# Altium schematic symbol library 13-Logicold 逻辑 IC.SchLib: 297 symbols (part 6 of 30)
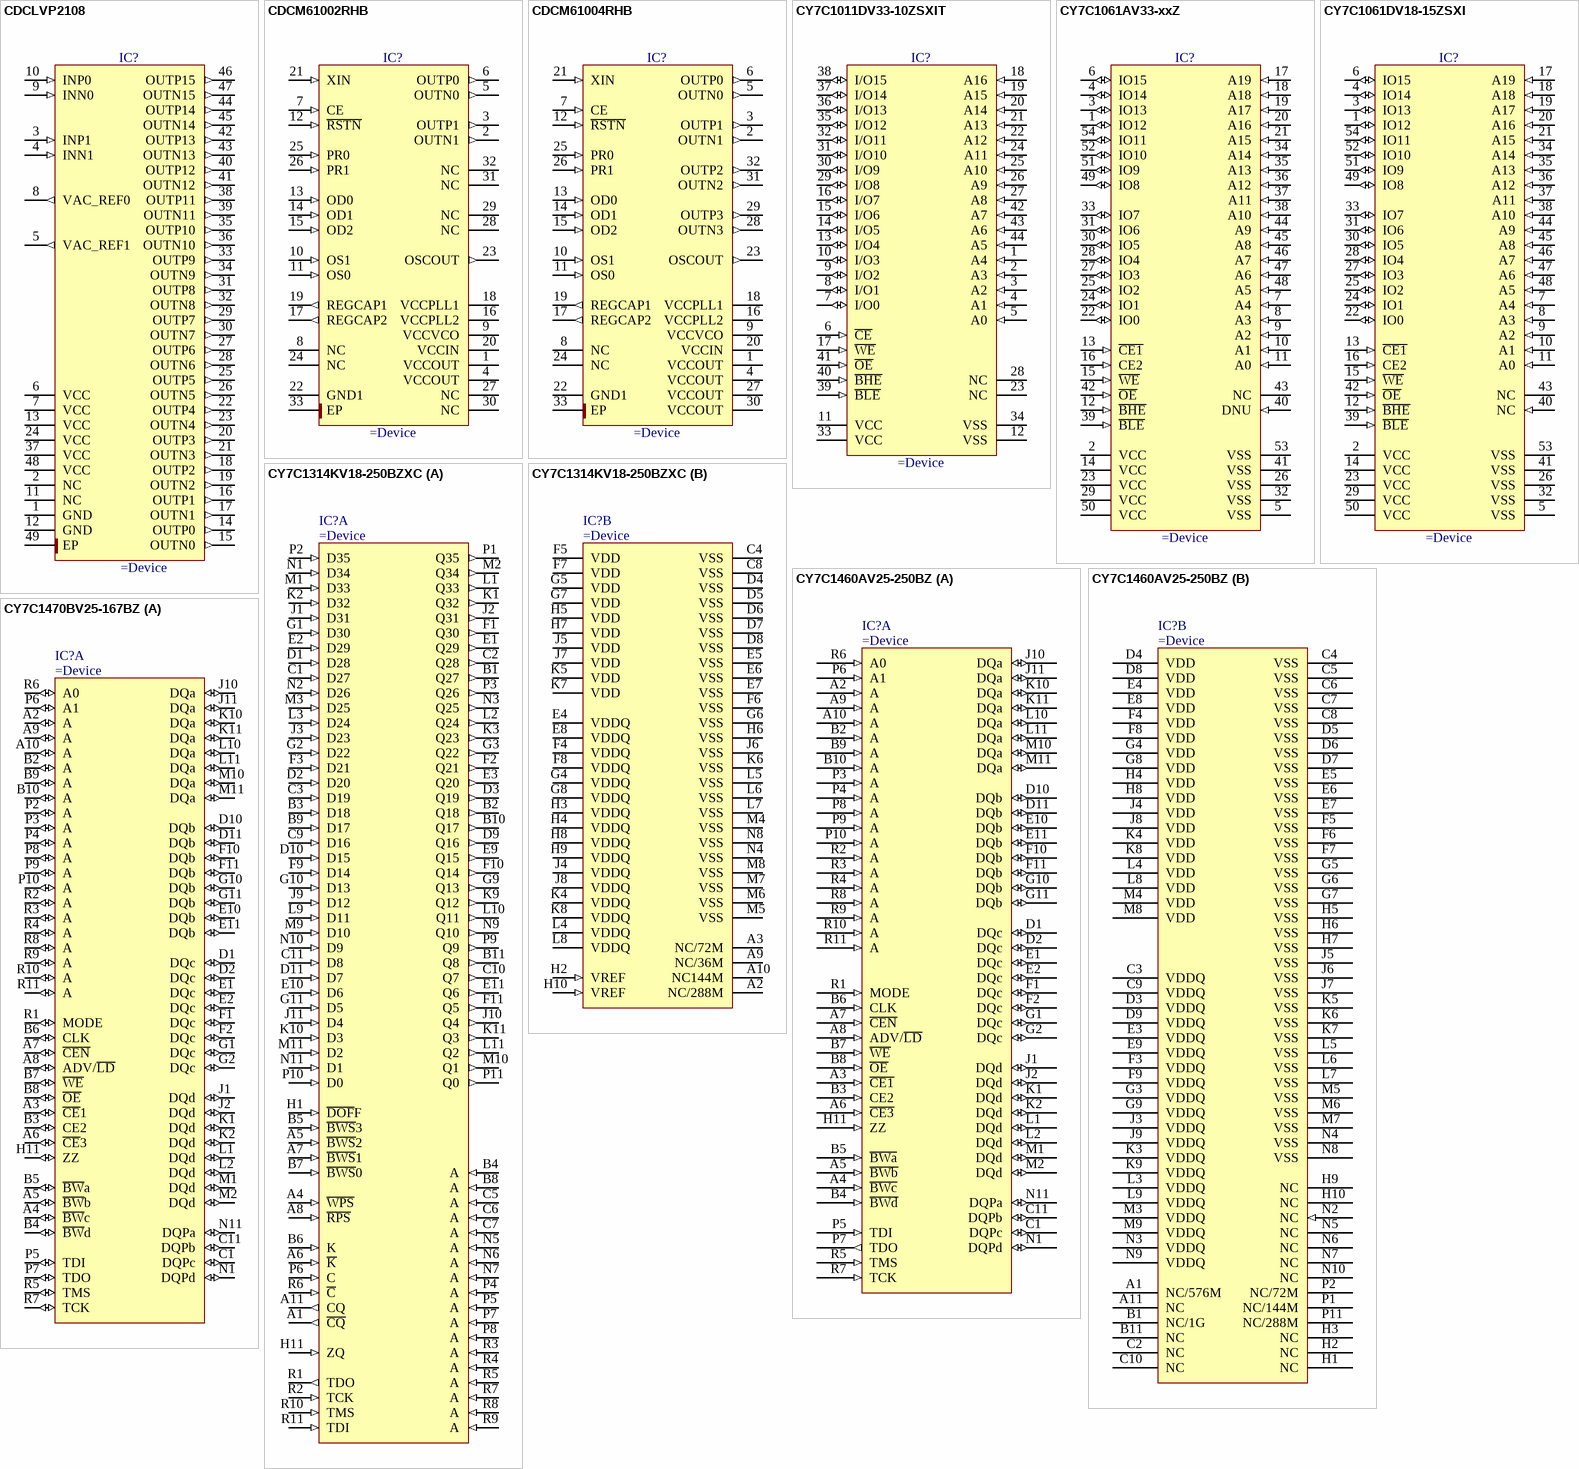
[diagram p167: symbols CDCLVP2108 to CY7C1470BV25-167BZ]

## CDCM61004RHB
designator IC?
Four Output, Integrated VCO, Low-Jitter Clock Generator
pins: 1 VCCOUT (power), 2 OUTN1 (out), 3 OUTP1 (out), 4 VCCOUT (power), 5 OUTN0 (out), 6 OUTP0 (out), 7 CE (in), 8 NC, 9 VCCVCO (power), 10 OS1 (in), 11 OS0 (in), 12 ~{RSTN} (in), 13 OD0 (in), 14 OD1 (in), 15 OD2 (in), 16 VCCPLL2 (power), 17 REGCAP2 (out), 18 VCCPLL1 (power), 19 REGCAP1 (out), 20 VCCIN (power), 21 XIN (in), 22 GND1 (power), 23 OSCOUT (out), 24 NC, 25 PR0 (in), 26 PR1 (in), 27 VCCOUT (power), 28 OUTN3 (out), 29 OUTP3 (out), 30 VCCOUT (power), 31 OUTN2 (out), 32 OUTP2 (out), 33 EP (power)

## CY7C1011DV33-10ZSXIT
designator IC?
2Mbit (128K x 16), 10ns 3.3V Static RAM
pins: 1 A4 (in), 2 A3 (in), 3 A2 (in), 4 A1 (in), 5 A0 (in), 6 ~{CE} (in), 7 I/O0 (io), 8 I/O1 (io), 9 I/O2 (io), 10 I/O3 (io), 11 VCC (power), 12 VSS (power), 13 I/O4 (io), 14 I/O5 (io), 15 I/O6 (io), 16 I/O7 (io), 17 ~{WE} (in), 18 A16 (in), 19 A15 (in), 20 A14 (in), 21 A13 (in), 22 A12 (in), 23 NC, 24 A11 (in), 25 A10 (in), 26 A9 (in), 27 A8 (in), 28 NC, 29 I/O8 (io), 30 I/O9 (io), 31 I/O10 (io), 32 I/O11 (io), 33 VCC (power), 34 VSS (power), 35 I/O12 (io), 36 I/O13 (io), 37 I/O14 (io), 38 I/O15 (io), 39 ~{BLE} (in), 40 ~{BHE} (in), 41 ~{OE} (in), 42 A7 (in), 43 A6 (in), 44 A5 (in)

## CY7C1061AV33-xxZ
designator IC?
16-Mbit (1M x 16) Static RAM
pins: 1 IO12 (io), 2 VCC (power), 3 IO13 (io), 4 IO14 (io), 5 VSS (power), 6 IO15 (io), 7 A4 (in), 8 A3 (in), 9 A2 (in), 10 A1 (in), 11 A0 (in), 12 ~{BHE} (in), 13 ~{CE1} (in), 14 VCC (power), 15 ~{WE} (in), 16 CE2 (in), 17 A19 (in), 18 A18 (in), 19 A17 (in), 20 A16 (in), 21 A15 (in), 22 IO0 (io), 23 VCC (power), 24 IO1 (io), 25 IO2 (io), 26 VSS (power), 27 IO3 (io), 28 IO4 (io), 29 VCC (power), 30 IO5 (io), 31 IO6 (io), 32 VSS (power), 33 IO7 (io), 34 A14 (in), 35 A13 (in), 36 A12 (in), 37 A11 (in), 38 A10 (in), 39 ~{BLE} (in), 40 DNU (in), 41 VSS (power), 42 ~{OE} (in), 43 NC, 44 A9 (in), 45 A8 (in), 46 A7 (in), 47 A6 (in), 48 A5 (in), 49 IO8 (io), 50 VCC (power), 51 IO9 (io), 52 IO10 (io), 53 VSS (power), 54 IO11 (io)

## CY7C1061DV18-15ZSXI
designator IC?
16-Mbit (1M x 16) Static RAM
pins: 1 IO12 (io), 2 VCC (power), 3 IO13 (io), 4 IO14 (io), 5 VSS (power), 6 IO15 (io), 7 A4 (in), 8 A3 (in), 9 A2 (in), 10 A1 (in), 11 A0 (in), 12 ~{BHE} (in), 13 ~{CE1} (in), 14 VCC (power), 15 ~{WE} (in), 16 CE2 (in), 17 A19 (in), 18 A18 (in), 19 A17 (in), 20 A16 (in), 21 A15 (in), 22 IO0 (io), 23 VCC (power), 24 IO1 (io), 25 IO2 (io), 26 VSS (power), 27 IO3 (io), 28 IO4 (io), 29 VCC (power), 30 IO5 (io), 31 IO6 (io), 32 VSS (power), 33 IO7 (io), 34 A14 (in), 35 A13 (in), 36 A12 (in), 37 A11 (in), 38 A10 (in), 39 ~{BLE} (in), 40 NC (in), 41 VSS (power), 42 ~{OE} (in), 43 NC, 44 A9 (in), 45 A8 (in), 46 A7 (in), 47 A6 (in), 48 A5 (in), 49 IO8 (io), 50 VCC (power), 51 IO9 (io), 52 IO10 (io), 53 VSS (power), 54 IO11 (io)

## CY7C1314KV18-250BZXC
designator IC?
1.8V, 250MHz, 18-Mbit (512k X 36) QDR®II SRAM 2-Word Burst Architecture
part A pins: A1 ~{CQ} (out), A4 ~{WPS} (in), A5 ~{BWS}2 (in), A6 ~{K} (in), A7 ~{BWS}1 (in), A8 ~{RPS} (in), A11 CQ (out), B1 Q27 (out), B2 Q18 (out), B3 D18 (in), B4 A (in), B5 ~{BWS}3 (in), B6 K (in), B7 ~{BWS}0 (in), B8 A (in), B9 D17 (in), B10 Q17 (out), B11 Q8 (out), C1 D27 (in), C2 Q28 (out), C3 D19 (in), C5 A (in), C6 A (in), C7 A (in), C9 D16 (in), C10 Q7 (out), C11 D8 (in), D1 D28 (in), D2 D20 (in), D3 Q19 (out), D9 Q16 (out), D10 D15 (in), D11 D7 (in), E1 Q29 (out), E2 D29 (in), E3 Q20 (out), E9 Q15 (out), E10 D6 (in), E11 Q6 (out), F1 Q30 (out), F2 Q21 (out), F3 D21 (in), F9 D14 (in), F10 Q14 (out), F11 Q5 (out), G1 D30 (in), G2 D22 (in), G3 Q22 (out), G9 Q13 (out), G10 D13 (in), G11 D5 (in), H1 ~{DOF}F (in), H11 ZQ (in), J1 D31 (in), J2 Q31 (out), J3 D23 (in), J9 D12 (in), J10 Q4 (out), J11 D4 (in), K1 Q32 (out), K2 D32 (in), K3 Q23 (out), K9 Q12 (out), K10 D3 (in), K11 Q3 (out), L1 Q33 (out), L2 Q24 (out), L3 D24 (in), L9 D11 (in), L10 Q11 (out), L11 Q2 (out), M1 D33 (in), M2 Q34 (out), M3 D25 (in), M9 D10 (in), M10 Q1 (out), M11 D2 (in), N1 D34 (in), N2 D26 (in), N3 Q25 (out), N5 A (in), N6 A (in), N7 A (in), N9 Q10 (out), N10 D9 (in), N11 D1 (in), P1 Q35 (out), P2 D35 (in), P3 Q26 (out), P4 A (in), P5 A (in), P6 C (in), P7 A (in), P8 A (in), P9 Q9 (out), P10 D0 (in), P11 Q0 (out), R1 TDO (out), R2 TCK (in), R3 A (in), R4 A (in), R5 A (in), R6 ~{C} (in), R7 A (in), R8 A (in), R9 A (in), R10 TMS (in), R11 TDI (in)
part B pins: A2 NC/288M, A3 NC/72M, A9 NC/36M, A10 NC144M, C4 VSS (power), C8 VSS (power), D4 VSS (power), D5 VSS (power), D6 VSS (power), D7 VSS (power), D8 VSS (power), E4 VDDQ (power), E5 VSS (power), E6 VSS (power), E7 VSS (power), E8 VDDQ (power), F4 VDDQ (power), F5 VDD (power), F6 VSS (power), F7 VDD (power), F8 VDDQ (power), G4 VDDQ (power), G5 VDD (power), G6 VSS (power), G7 VDD (power), G8 VDDQ (power), H2 VREF (in), H3 VDDQ (power), H4 VDDQ (power), H5 VDD (power), H6 VSS (power), H7 VDD (power), H8 VDDQ (power), H9 VDDQ (power), H10 VREF (in), J4 VDDQ (power), J5 VDD (power), J6 VSS (power), J7 VDD (power), J8 VDDQ (power), K4 VDDQ (power), K5 VDD (power), K6 VSS (power), K7 VDD (power), K8 VDDQ (power), L4 VDDQ (power), L5 VSS (power), L6 VSS (power), L7 VSS (power), L8 VDDQ (power), M4 VSS (power), M5 VSS (power), M6 VSS (power), M7 VSS (power), M8 VSS (power), N4 VSS (power), N8 VSS (power)

## CY7C1460AV25-250BZ
designator IC?
36-Mbit (1M x 36) Pipelined SRAM with NoBL Architecture
part A pins: A2 A (in), A3 ~{CE1} (in), A4 ~{BWc} (in), A5 ~{BWb} (in), A6 ~{CE3} (in), A7 ~{CEN} (in), A8 ADV/~{LD} (in), A9 A (in), A10 A (in), B2 A (in), B3 CE2 (in), B4 ~{BWd} (in), B5 ~{BWa} (in), B6 CLK (in), B7 ~{WE} (in), B8 ~{OE} (in), B9 A (in), B10 A (in), C1 DQPc (io), C11 DQPb (io), D1 DQc (io), D2 DQc (io), D10 DQb (io), D11 DQb (io), E1 DQc (io), E2 DQc (io), E10 DQb (io), E11 DQb (io), F1 DQc (io), F2 DQc (io), F10 DQb (io), F11 DQb (io), G1 DQc (io), G2 DQc (io), G10 DQb (io), G11 DQb (io), H11 ZZ (in), J1 DQd (io), J2 DQd (io), J10 DQa (io), J11 DQa (io), K1 DQd (io), K2 DQd (io), K10 DQa (io), K11 DQa (io), L1 DQd (io), L2 DQd (io), L10 DQa (io), L11 DQa (io), M1 DQd (io), M2 DQd (io), M10 DQa (io), M11 DQa (io), N1 DQPd (io), N11 DQPa (io), P3 A (in), P4 A (in), P5 TDI (in), P6 A1 (in), P7 TDO (out), P8 A (in), P9 A (in), P10 A (in), R1 MODE (in), R2 A (in), R3 A (in), R4 A (in), R5 TMS (in), R6 A0 (in), R7 TCK (in), R8 A (in), R9 A (in), R10 A (in), R11 A (in)
part B pins: A1 NC/576M, A11 NC, B1 NC/1G, B11 NC, C2 NC, C3 VDDQ (power), C4 VSS (power), C5 VSS (power), C6 VSS (power), C7 VSS (power), C8 VSS (power), C9 VDDQ (power), C10 NC, D3 VDDQ (power), D4 VDD (power), D5 VSS (power), D6 VSS (power), D7 VSS (power), D8 VDD (power), D9 VDDQ (power), E3 VDDQ (power), E4 VDD (power), E5 VSS (power), E6 VSS (power), E7 VSS (power), E8 VDD (power), E9 VDDQ (power), F3 VDDQ (power), F4 VDD (power), F5 VSS (power), F6 VSS (power), F7 VSS (power), F8 VDD (power), F9 VDDQ (power), G3 VDDQ (power), G4 VDD (power), G5 VSS (power), G6 VSS (power), G7 VSS (power), G8 VDD (power), G9 VDDQ (power), H1 NC, H2 NC, H3 NC, H4 VDD (power), H5 VSS (power), H6 VSS (power), H7 VSS (power), H8 VDD (power), H9 NC, H10 NC, J3 VDDQ (power), J4 VDD (power), J5 VSS (power), J6 VSS (power), J7 VSS (power), J8 VDD (power), J9 VDDQ (power), K3 VDDQ (power), K4 VDD (power), K5 VSS (power), K6 VSS (power), K7 VSS (power), K8 VDD (power), K9 VDDQ (power), L3 VDDQ (power), L4 VDD (power), L5 VSS (power), L6 VSS (power), L7 VSS (power), L8 VDD (power), L9 VDDQ (power), M3 VDDQ (power), M4 VDD (power), M5 VSS (power), M6 VSS (power), M7 VSS (power), M8 VDD (power), M9 VDDQ (power), N2 NC (in), N3 VDDQ (power), N4 VSS (power), N5 NC, N6 NC, N7 NC, N8 VSS (power), N9 VDDQ (power), N10 NC, P1 NC/144M, P2 NC/72M, P11 NC/288M

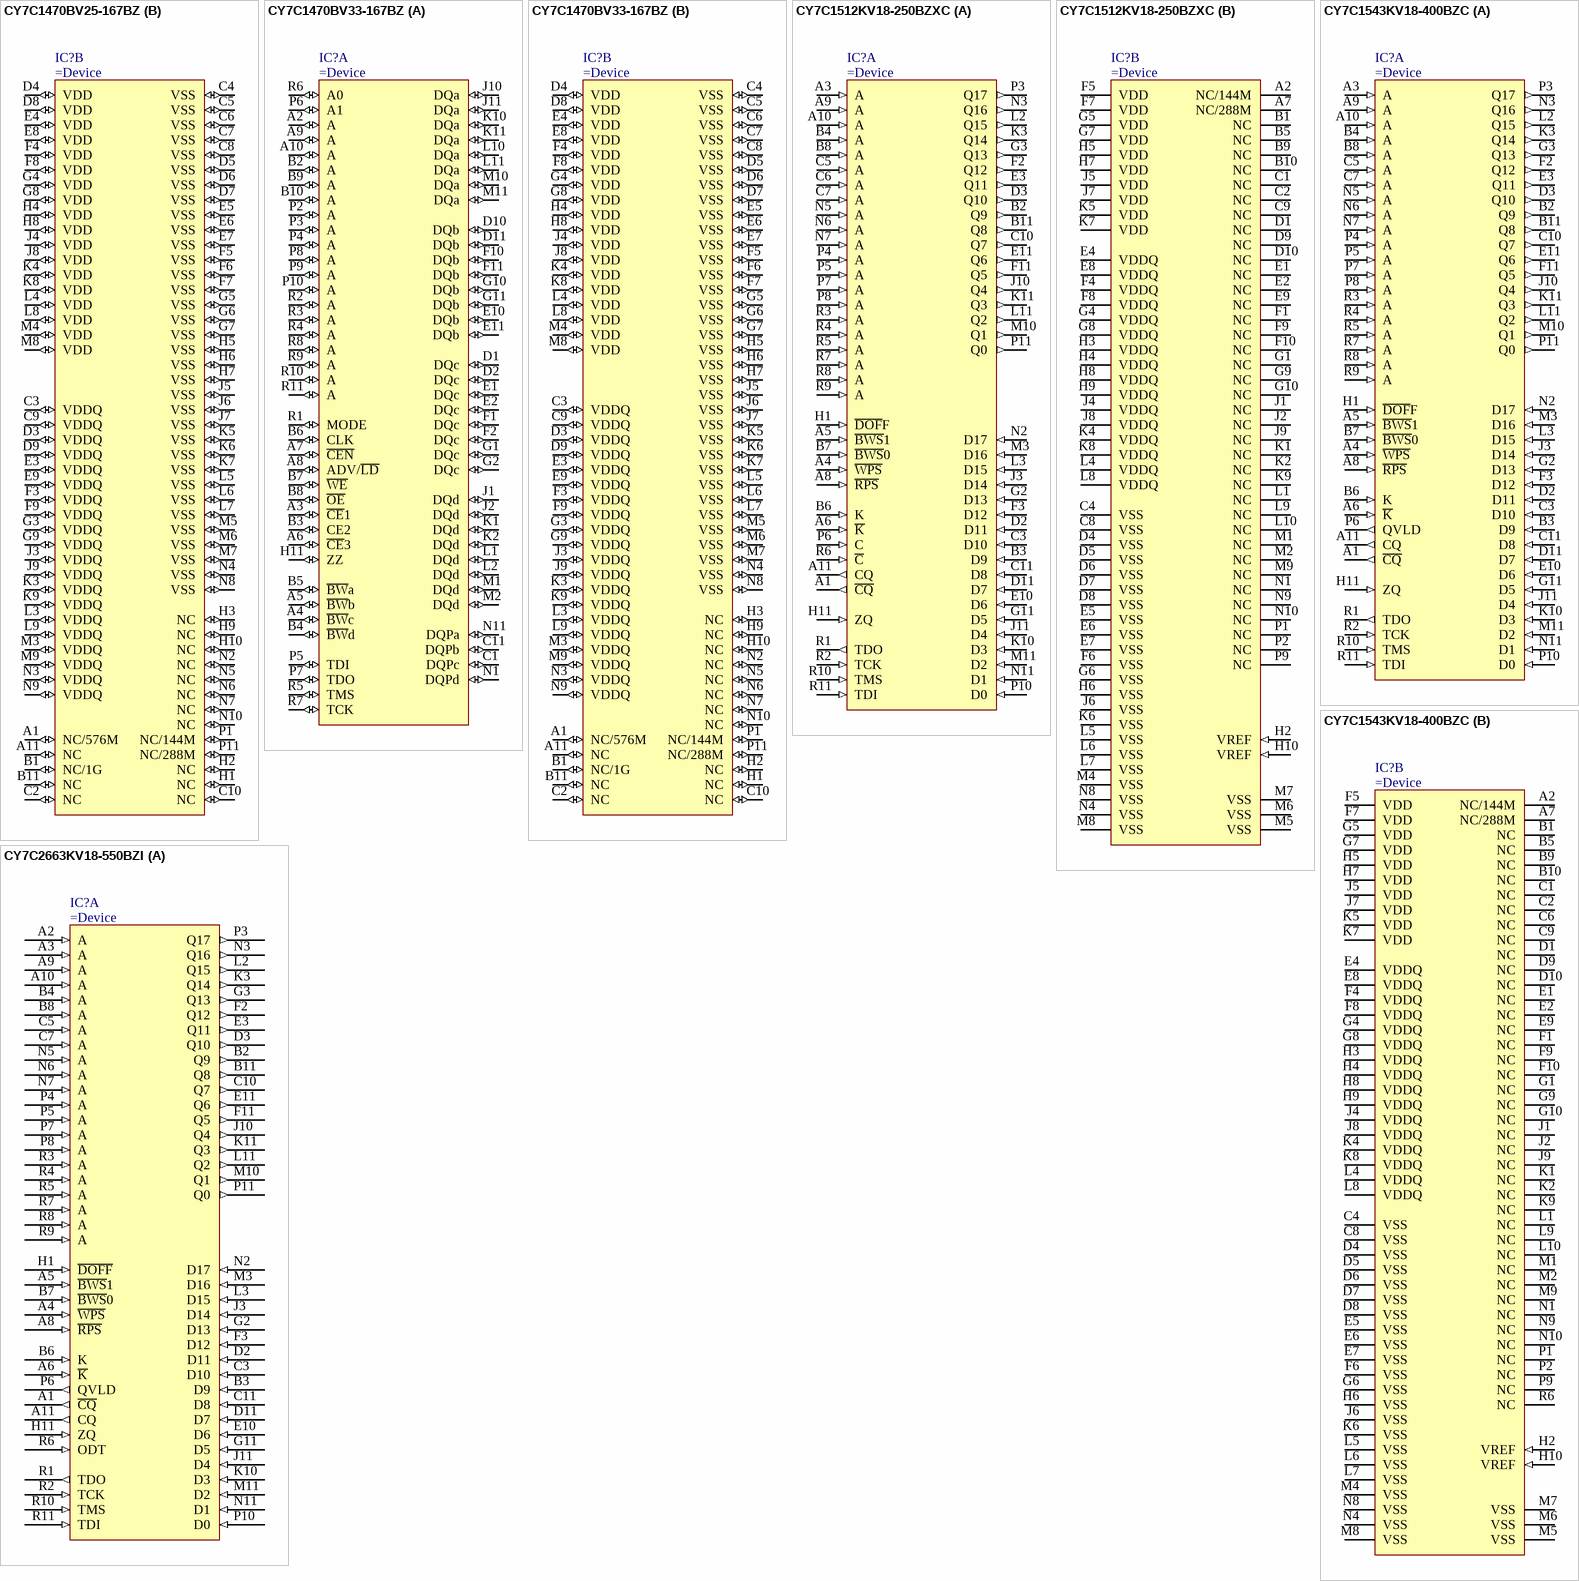
[diagram p32: symbols CY7C1470BV25-167BZ to CY7C2663KV18-550BZI]

## CY7C1470BV25-167BZ
designator IC?
72-Mbit (2M x 36) Pipelined SRAM with NoBL Architecture
part A pins: A2 A (io), A3 ~{CE}1 (io), A4 ~{BW}c (io), A5 ~{BW}b (io), A6 ~{CE}3 (io), A7 ~{CEN} (io), A8 ADV/~{LD} (io), A9 A (io), A10 A (io), B2 A (io), B3 CE2 (io), B4 ~{BW}d (io), B5 ~{BW}a (io), B6 CLK (io), B7 ~{WE} (io), B8 ~{OE} (io), B9 A (io), B10 A (io), C1 DQPc (io), C11 DQPb (io), D1 DQc (io), D2 DQc (io), D10 DQb (io), D11 DQb (io), E1 DQc (io), E2 DQc (io), E10 DQb (io), E11 DQb (io), F1 DQc (io), F2 DQc (io), F10 DQb (io), F11 DQb (io), G1 DQc (io), G2 DQc (io), G10 DQb (io), G11 DQb (io), H11 ZZ (io), J1 DQd (io), J2 DQd (io), J10 DQa (io), J11 DQa (io), K1 DQd (io), K2 DQd (io), K10 DQa (io), K11 DQa (io), L1 DQd (io), L2 DQd (io), L10 DQa (io), L11 DQa (io), M1 DQd (io), M2 DQd (io), M10 DQa (io), M11 DQa (io), N1 DQPd (io), N11 DQPa (io), P2 A (io), P3 A (io), P4 A (io), P5 TDI (io), P6 A1 (io), P7 TDO (io), P8 A (io), P9 A (io), P10 A (io), R1 MODE (io), R2 A (io), R3 A (io), R4 A (io), R5 TMS (io), R6 A0 (io), R7 TCK (io), R8 A (io), R9 A (io), R10 A (io), R11 A (io)
part B pins: A1 NC/576M (io), A11 NC (io), B1 NC/1G (io), B11 NC (io), C2 NC (io), C3 VDDQ (io), C4 VSS (io), C5 VSS (io), C6 VSS (io), C7 VSS (io), C8 VSS (io), C9 VDDQ (io), C10 NC (io), D3 VDDQ (io), D4 VDD (io), D5 VSS (io), D6 VSS (io), D7 VSS (io), D8 VDD (io), D9 VDDQ (io), E3 VDDQ (io), E4 VDD (io), E5 VSS (io), E6 VSS (io), E7 VSS (io), E8 VDD (io), E9 VDDQ (io), F3 VDDQ (io), F4 VDD (io), F5 VSS (io), F6 VSS (io), F7 VSS (io), F8 VDD (io), F9 VDDQ (io), G3 VDDQ (io), G4 VDD (io), G5 VSS (io), G6 VSS (io), G7 VSS (io), G8 VDD (io), G9 VDDQ (io), H1 NC (io), H2 NC (io), H3 NC (io), H4 VDD (io), H5 VSS (io), H6 VSS (io), H7 VSS (io), H8 VDD (io), H9 NC (io), H10 NC (io), J3 VDDQ (io), J4 VDD (io), J5 VSS (io), J6 VSS (io), J7 VSS (io), J8 VDD (io), J9 VDDQ (io), K3 VDDQ (io), K4 VDD (io), K5 VSS (io), K6 VSS (io), K7 VSS (io), K8 VDD (io), K9 VDDQ (io), L3 VDDQ (io), L4 VDD (io), L5 VSS (io), L6 VSS (io), L7 VSS (io), L8 VDD (io), L9 VDDQ (io), M3 VDDQ (io), M4 VDD (io), M5 VSS (io), M6 VSS (io), M7 VSS (io), M8 VDD (io), M9 VDDQ (io), N2 NC (io), N3 VDDQ (io), N4 VSS (io), N5 NC (io), N6 NC (io), N7 NC (io), N8 VSS (io), N9 VDDQ (io), N10 NC (io), P1 NC/144M (io), P11 NC/288M (io)

## CY7C1470BV33-167BZ
designator IC?
72-Mbit (2M x 36) Pipelined 3.3V SRAM with NoBL Architecture
part A pins: A2 A (io), A3 ~{CE}1 (io), A4 ~{BW}c (io), A5 ~{BW}b (io), A6 ~{CE}3 (io), A7 ~{CEN} (io), A8 ADV/~{LD} (io), A9 A (io), A10 A (io), B2 A (io), B3 CE2 (io), B4 ~{BW}d (io), B5 ~{BW}a (io), B6 CLK (io), B7 ~{WE} (io), B8 ~{OE} (io), B9 A (io), B10 A (io), C1 DQPc (io), C11 DQPb (io), D1 DQc (io), D2 DQc (io), D10 DQb (io), D11 DQb (io), E1 DQc (io), E2 DQc (io), E10 DQb (io), E11 DQb (io), F1 DQc (io), F2 DQc (io), F10 DQb (io), F11 DQb (io), G1 DQc (io), G2 DQc (io), G10 DQb (io), G11 DQb (io), H11 ZZ (io), J1 DQd (io), J2 DQd (io), J10 DQa (io), J11 DQa (io), K1 DQd (io), K2 DQd (io), K10 DQa (io), K11 DQa (io), L1 DQd (io), L2 DQd (io), L10 DQa (io), L11 DQa (io), M1 DQd (io), M2 DQd (io), M10 DQa (io), M11 DQa (io), N1 DQPd (io), N11 DQPa (io), P2 A (io), P3 A (io), P4 A (io), P5 TDI (io), P6 A1 (io), P7 TDO (io), P8 A (io), P9 A (io), P10 A (io), R1 MODE (io), R2 A (io), R3 A (io), R4 A (io), R5 TMS (io), R6 A0 (io), R7 TCK (io), R8 A (io), R9 A (io), R10 A (io), R11 A (io)
part B pins: A1 NC/576M (io), A11 NC (io), B1 NC/1G (io), B11 NC (io), C2 NC (io), C3 VDDQ (io), C4 VSS (io), C5 VSS (io), C6 VSS (io), C7 VSS (io), C8 VSS (io), C9 VDDQ (io), C10 NC (io), D3 VDDQ (io), D4 VDD (io), D5 VSS (io), D6 VSS (io), D7 VSS (io), D8 VDD (io), D9 VDDQ (io), E3 VDDQ (io), E4 VDD (io), E5 VSS (io), E6 VSS (io), E7 VSS (io), E8 VDD (io), E9 VDDQ (io), F3 VDDQ (io), F4 VDD (io), F5 VSS (io), F6 VSS (io), F7 VSS (io), F8 VDD (io), F9 VDDQ (io), G3 VDDQ (io), G4 VDD (io), G5 VSS (io), G6 VSS (io), G7 VSS (io), G8 VDD (io), G9 VDDQ (io), H1 NC (io), H2 NC (io), H3 NC (io), H4 VDD (io), H5 VSS (io), H6 VSS (io), H7 VSS (io), H8 VDD (io), H9 NC (io), H10 NC (io), J3 VDDQ (io), J4 VDD (io), J5 VSS (io), J6 VSS (io), J7 VSS (io), J8 VDD (io), J9 VDDQ (io), K3 VDDQ (io), K4 VDD (io), K5 VSS (io), K6 VSS (io), K7 VSS (io), K8 VDD (io), K9 VDDQ (io), L3 VDDQ (io), L4 VDD (io), L5 VSS (io), L6 VSS (io), L7 VSS (io), L8 VDD (io), L9 VDDQ (io), M3 VDDQ (io), M4 VDD (io), M5 VSS (io), M6 VSS (io), M7 VSS (io), M8 VDD (io), M9 VDDQ (io), N2 NC (io), N3 VDDQ (io), N4 VSS (io), N5 NC (io), N6 NC (io), N7 NC (io), N8 VSS (io), N9 VDDQ (io), N10 NC (io), P1 NC/144M (io), P11 NC/288M (io)

## CY7C1512KV18-250BZXC
designator IC?
72-Mbit QDR® II SRAM 2-Word Burst Architecture
part A pins: A1 ~{CQ} (out), A3 A (in), A4 ~{WPS} (in), A5 ~{BWS}1 (in), A6 ~{K} (in), A8 ~{RPS} (in), A9 A (in), A10 A (in), A11 CQ (out), B2 Q9 (out), B3 D9 (in), B4 A (in), B6 K (in), B7 ~{BWS}0 (in), B8 A (in), B11 Q8 (out), C3 D10 (in), C5 A (in), C6 A (in), C7 A (in), C10 Q7 (out), C11 D8 (in), D2 D11 (in), D3 Q10 (out), D11 D7 (in), E3 Q11 (out), E10 D6 (in), E11 Q6 (out), F2 Q12 (out), F3 D12 (in), F11 Q5 (out), G2 D13 (in), G3 Q13 (out), G11 D5 (in), H1 ~{DOF}F (in), H11 ZQ (in), J3 D14 (in), J10 Q4 (out), J11 D4 (in), K3 Q14 (out), K10 D3 (in), K11 Q3 (out), L2 Q15 (out), L3 D15 (in), L11 Q2 (out), M3 D16 (in), M10 Q1 (out), M11 D2 (in), N2 D17 (in), N3 Q16 (out), N5 A (in), N6 A (in), N7 A (in), N11 D1 (in), P3 Q17 (out), P4 A (in), P5 A (in), P6 C (in), P7 A (in), P8 A (in), P10 D0 (in), P11 Q0 (out), R1 TDO (out), R2 TCK (in), R3 A (in), R4 A (in), R5 A (in), R6 ~{C} (in), R7 A (in), R8 A (in), R9 A (in), R10 TMS (in), R11 TDI (in)
part B pins: A2 NC/144M, A7 NC/288M, B1 NC, B5 NC, B9 NC, B10 NC, C1 NC, C2 NC, C4 VSS (power), C8 VSS (power), C9 NC, D1 NC, D4 VSS (power), D5 VSS (power), D6 VSS (power), D7 VSS (power), D8 VSS (power), D9 NC, D10 NC, E1 NC, E2 NC, E4 VDDQ (power), E5 VSS (power), E6 VSS (power), E7 VSS (power), E8 VDDQ (power), E9 NC, F1 NC, F4 VDDQ (power), F5 VDD (power), F6 VSS (power), F7 VDD (power), F8 VDDQ (power), F9 NC, F10 NC, G1 NC, G4 VDDQ (power), G5 VDD (power), G6 VSS (power), G7 VDD (power), G8 VDDQ (power), G9 NC, G10 NC, H2 VREF (in), H3 VDDQ (power), H4 VDDQ (power), H5 VDD (power), H6 VSS (power), H7 VDD (power), H8 VDDQ (power), H9 VDDQ (power), H10 VREF (in), J1 NC, J2 NC, J4 VDDQ (power), J5 VDD (power), J6 VSS (power), J7 VDD (power), J8 VDDQ (power), J9 NC, K1 NC, K2 NC, K4 VDDQ (power), K5 VDD (power), K6 VSS (power), K7 VDD (power), K8 VDDQ (power), K9 NC, L1 NC, L4 VDDQ (power), L5 VSS (power), L6 VSS (power), L7 VSS (power), L8 VDDQ (power), L9 NC, L10 NC, M1 NC, M2 NC, M4 VSS (power), M5 VSS (power), M6 VSS (power), M7 VSS (power), M8 VSS (power), M9 NC, N1 NC, N4 VSS (power), N8 VSS (power), N9 NC, N10 NC, P1 NC, P2 NC, P9 NC

## CY7C1543KV18-400BZC
designator IC?
72-Mbit QDR®II+ SRAM 4-Word Burst Architecture (2.0 Cycle Read Latency)
part A pins: A1 ~{CQ} (out), A3 A (in), A4 ~{WPS} (in), A5 ~{BWS}1 (in), A6 ~{K} (in), A8 ~{RPS} (in), A9 A (in), A10 A (in), A11 CQ (out), B2 Q9 (out), B3 D9 (in), B4 A (in), B6 K (in), B7 ~{BWS}0 (in), B8 A (in), B11 Q8 (out), C3 D10 (in), C5 A (in), C7 A (in), C10 Q7 (out), C11 D8 (in), D2 D11 (in), D3 Q10 (out), D11 D7 (in), E3 Q11 (out), E10 D6 (in), E11 Q6 (out), F2 Q12 (out), F3 D12 (in), F11 Q5 (out), G2 D13 (in), G3 Q13 (out), G11 D5 (in), H1 ~{DOF}F (in), H11 ZQ (in), J3 D14 (in), J10 Q4 (out), J11 D4 (in), K3 Q14 (out), K10 D3 (in), K11 Q3 (out), L2 Q15 (out), L3 D15 (in), L11 Q2 (out), M3 D16 (in), M10 Q1 (out), M11 D2 (in), N2 D17 (in), N3 Q16 (out), N5 A (in), N6 A (in), N7 A (in), N11 D1 (in), P3 Q17 (out), P4 A (in), P5 A (in), P6 QVLD (out), P7 A (in), P8 A (in), P10 D0 (in), P11 Q0 (out), R1 TDO (out), R2 TCK (in), R3 A (in), R4 A (in), R5 A (in), R7 A (in), R8 A (in), R9 A (in), R10 TMS (in), R11 TDI (in)
part B pins: A2 NC/144M, A7 NC/288M, B1 NC, B5 NC, B9 NC, B10 NC, C1 NC, C2 NC, C4 VSS (power), C6 NC, C8 VSS (power), C9 NC, D1 NC, D4 VSS (power), D5 VSS (power), D6 VSS (power), D7 VSS (power), D8 VSS (power), D9 NC, D10 NC, E1 NC, E2 NC, E4 VDDQ (power), E5 VSS (power), E6 VSS (power), E7 VSS (power), E8 VDDQ (power), E9 NC, F1 NC, F4 VDDQ (power), F5 VDD (power), F6 VSS (power), F7 VDD (power), F8 VDDQ (power), F9 NC, F10 NC, G1 NC, G4 VDDQ (power), G5 VDD (power), G6 VSS (power), G7 VDD (power), G8 VDDQ (power), G9 NC, G10 NC, H2 VREF (in), H3 VDDQ (power), H4 VDDQ (power), H5 VDD (power), H6 VSS (power), H7 VDD (power), H8 VDDQ (power), H9 VDDQ (power), H10 VREF (in), J1 NC, J2 NC, J4 VDDQ (power), J5 VDD (power), J6 VSS (power), J7 VDD (power), J8 VDDQ (power), J9 NC, K1 NC, K2 NC, K4 VDDQ (power), K5 VDD (power), K6 VSS (power), K7 VDD (power), K8 VDDQ (power), K9 NC, L1 NC, L4 VDDQ (power), L5 VSS (power), L6 VSS (power), L7 VSS (power), L8 VDDQ (power), L9 NC, L10 NC, M1 NC, M2 NC, M4 VSS (power), M5 VSS (power), M6 VSS (power), M7 VSS (power), M8 VSS (power), M9 NC, N1 NC, N4 VSS (power), N8 VSS (power), N9 NC, N10 NC, P1 NC, P2 NC, P9 NC, R6 NC

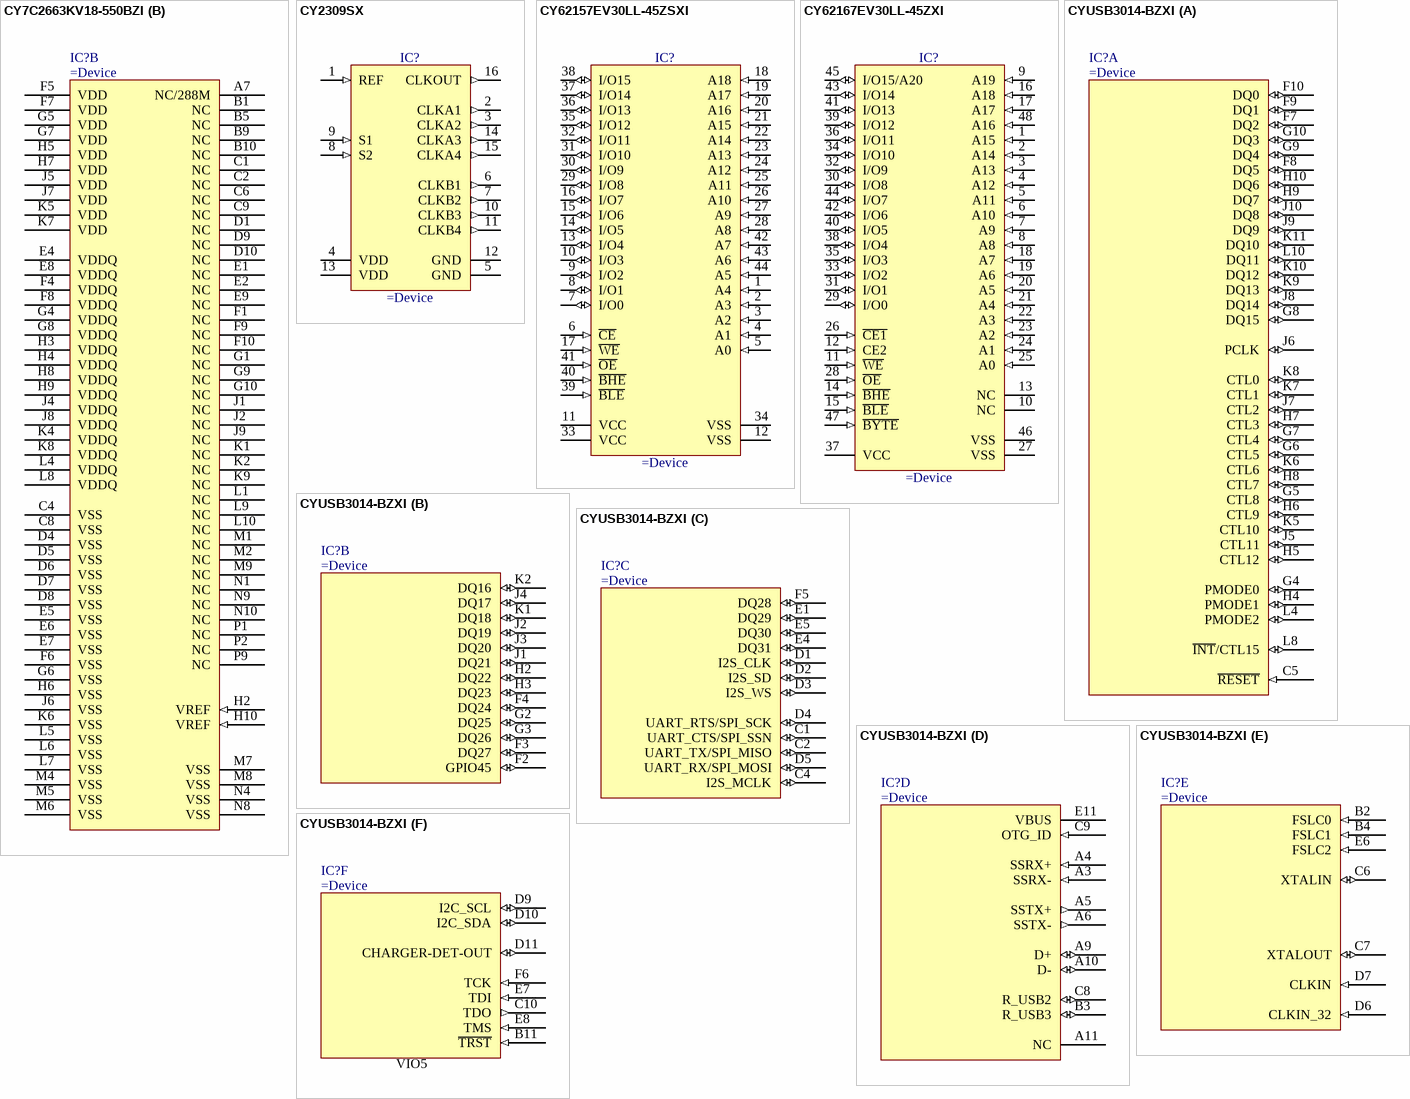
[diagram p33: symbols CY7C2663KV18-550BZI to CYUSB3014-BZXI]

## CY7C2663KV18-550BZI
designator IC?
144-Mbit QDR® II+ SRAM Four-Word Burst Architecture (2.5 Cycle Read Latency) with ODT
part A pins: A1 ~{CQ} (out), A2 A (in), A3 A (in), A4 ~{WPS} (in), A5 ~{BWS}1 (in), A6 ~{K} (in), A8 ~{RPS} (in), A9 A (in), A10 A (in), A11 CQ (out), B2 Q9 (out), B3 D9 (in), B4 A (in), B6 K (in), B7 ~{BWS}0 (in), B8 A (in), B11 Q8 (out), C3 D10 (in), C5 A (in), C7 A (in), C10 Q7 (out), C11 D8 (in), D2 D11 (in), D3 Q10 (out), D11 D7 (in), E3 Q11 (out), E10 D6 (in), E11 Q6 (out), F2 Q12 (out), F3 D12 (in), F11 Q5 (out), G2 D13 (in), G3 Q13 (out), G11 D5 (in), H1 ~{DOFF} (in), H11 ZQ (in), J3 D14 (in), J10 Q4 (out), J11 D4 (in), K3 Q14 (out), K10 D3 (in), K11 Q3 (out), L2 Q15 (out), L3 D15 (in), L11 Q2 (out), M3 D16 (in), M10 Q1 (out), M11 D2 (in), N2 D17 (in), N3 Q16 (out), N5 A (in), N6 A (in), N7 A (in), N11 D1 (in), P3 Q17 (out), P4 A (in), P5 A (in), P6 QVLD (out), P7 A (in), P8 A (in), P10 D0 (in), P11 Q0 (out), R1 TDO (out), R2 TCK (in), R3 A (in), R4 A (in), R5 A (in), R6 ODT (in), R7 A (in), R8 A (in), R9 A (in), R10 TMS (in), R11 TDI (in)
part B pins: A7 NC/288M, B1 NC, B5 NC, B9 NC, B10 NC, C1 NC, C2 NC, C4 VSS (power), C6 NC, C8 VSS (power), C9 NC, D1 NC, D4 VSS (power), D5 VSS (power), D6 VSS (power), D7 VSS (power), D8 VSS (power), D9 NC, D10 NC, E1 NC, E2 NC, E4 VDDQ (power), E5 VSS (power), E6 VSS (power), E7 VSS (power), E8 VDDQ (power), E9 NC, F1 NC, F4 VDDQ (power), F5 VDD (power), F6 VSS (power), F7 VDD (power), F8 VDDQ (power), F9 NC, F10 NC, G1 NC, G4 VDDQ (power), G5 VDD (power), G6 VSS (power), G7 VDD (power), G8 VDDQ (power), G9 NC, G10 NC, H2 VREF (in), H3 VDDQ (power), H4 VDDQ (power), H5 VDD (power), H6 VSS (power), H7 VDD (power), H8 VDDQ (power), H9 VDDQ (power), H10 VREF (in), J1 NC, J2 NC, J4 VDDQ (power), J5 VDD (power), J6 VSS (power), J7 VDD (power), J8 VDDQ (power), J9 NC, K1 NC, K2 NC, K4 VDDQ (power), K5 VDD (power), K6 VSS (power), K7 VDD (power), K8 VDDQ (power), K9 NC, L1 NC, L4 VDDQ (power), L5 VSS (power), L6 VSS (power), L7 VSS (power), L8 VDDQ (power), L9 NC, L10 NC, M1 NC, M2 NC, M4 VSS (power), M5 VSS (power), M6 VSS (power), M7 VSS (power), M8 VSS (power), M9 NC, N1 NC, N4 VSS (power), N8 VSS (power), N9 NC, N10 NC, P1 NC, P2 NC, P9 NC

## CY2309SX
designator IC?
Low Cost 3.3-V Zero Delay Buffer
pins: 1 REF (in), 2 CLKA1 (out), 3 CLKA2 (out), 4 VDD (power), 5 GND (power), 6 CLKB1 (out), 7 CLKB2 (out), 8 S2 (in), 9 S1 (in), 10 CLKB3 (out), 11 CLKB4 (out), 12 GND (power), 13 VDD (power), 14 CLKA3 (out), 15 CLKA4 (out), 16 CLKOUT (out)

## CY62157EV30LL-45ZSXI
designator IC?
8-Mbit (512 K × 16) Static RAM
pins: 1 A4 (in), 2 A3 (in), 3 A2 (in), 4 A1 (in), 5 A0 (in), 6 ~{CE} (in), 7 I/O0 (io), 8 I/O1 (io), 9 I/O2 (io), 10 I/O3 (io), 11 VCC (power), 12 VSS (power), 13 I/O4 (io), 14 I/O5 (io), 15 I/O6 (io), 16 I/O7 (io), 17 ~{WE} (in), 18 A18 (in), 19 A17 (in), 20 A16 (in), 21 A15 (in), 22 A14 (in), 23 A13 (in), 24 A12 (in), 25 A11 (in), 26 A10 (in), 27 A9 (in), 28 A8 (in), 29 I/O8 (io), 30 I/O9 (io), 31 I/O10 (io), 32 I/O11 (io), 33 VCC (power), 34 VSS (power), 35 I/O12 (io), 36 I/O13 (io), 37 I/O14 (io), 38 I/O15 (io), 39 ~{BLE} (in), 40 ~{BHE} (in), 41 ~{OE} (in), 42 A7 (in), 43 A6 (in), 44 A5 (in)

## CY62167EV30LL-45ZXI
designator IC?
16Mbit (1M x 16), 2.2V to 3.6V Static RAM
pins: 1 A15 (in), 2 A14 (in), 3 A13 (in), 4 A12 (in), 5 A11 (in), 6 A10 (in), 7 A9 (in), 8 A8 (in), 9 A19 (in), 10 NC, 11 ~{WE} (in), 12 CE2 (in), 13 NC, 14 ~{BHE} (in), 15 ~{BLE} (in), 16 A18 (in), 17 A17 (in), 18 A7 (in), 19 A6 (in), 20 A5 (in), 21 A4 (in), 22 A3 (in), 23 A2 (in), 24 A1 (in), 25 A0 (in), 26 ~{CE1} (in), 27 VSS (power), 28 ~{OE} (in), 29 I/O0 (io), 30 I/O8 (io), 31 I/O1 (io), 32 I/O9 (io), 33 I/O2 (io), 34 I/O10 (io), 35 I/O3 (io), 36 I/O11 (io), 37 VCC (power), 38 I/O4 (io), 39 I/O12 (io), 40 I/O5 (io), 41 I/O13 (io), 42 I/O6 (io), 43 I/O14 (io), 44 I/O7 (io), 45 I/O15/A20 (io), 46 VSS (power), 47 ~{BYTE} (in), 48 A16 (in)
